# Altium footprint library Connectors.PcbLib: 158 footprints (part 4 of 10)
Each footprint in its own frame and in the unit in brackets; x right, y up, seen from the top. Pads: shape width x height; smd on the part's side, far side on the other; paste and mask are expansions set on the pad; w line width, h text height; cw(c..) or ccw(c..) is an arc to the next point about the centre after c.
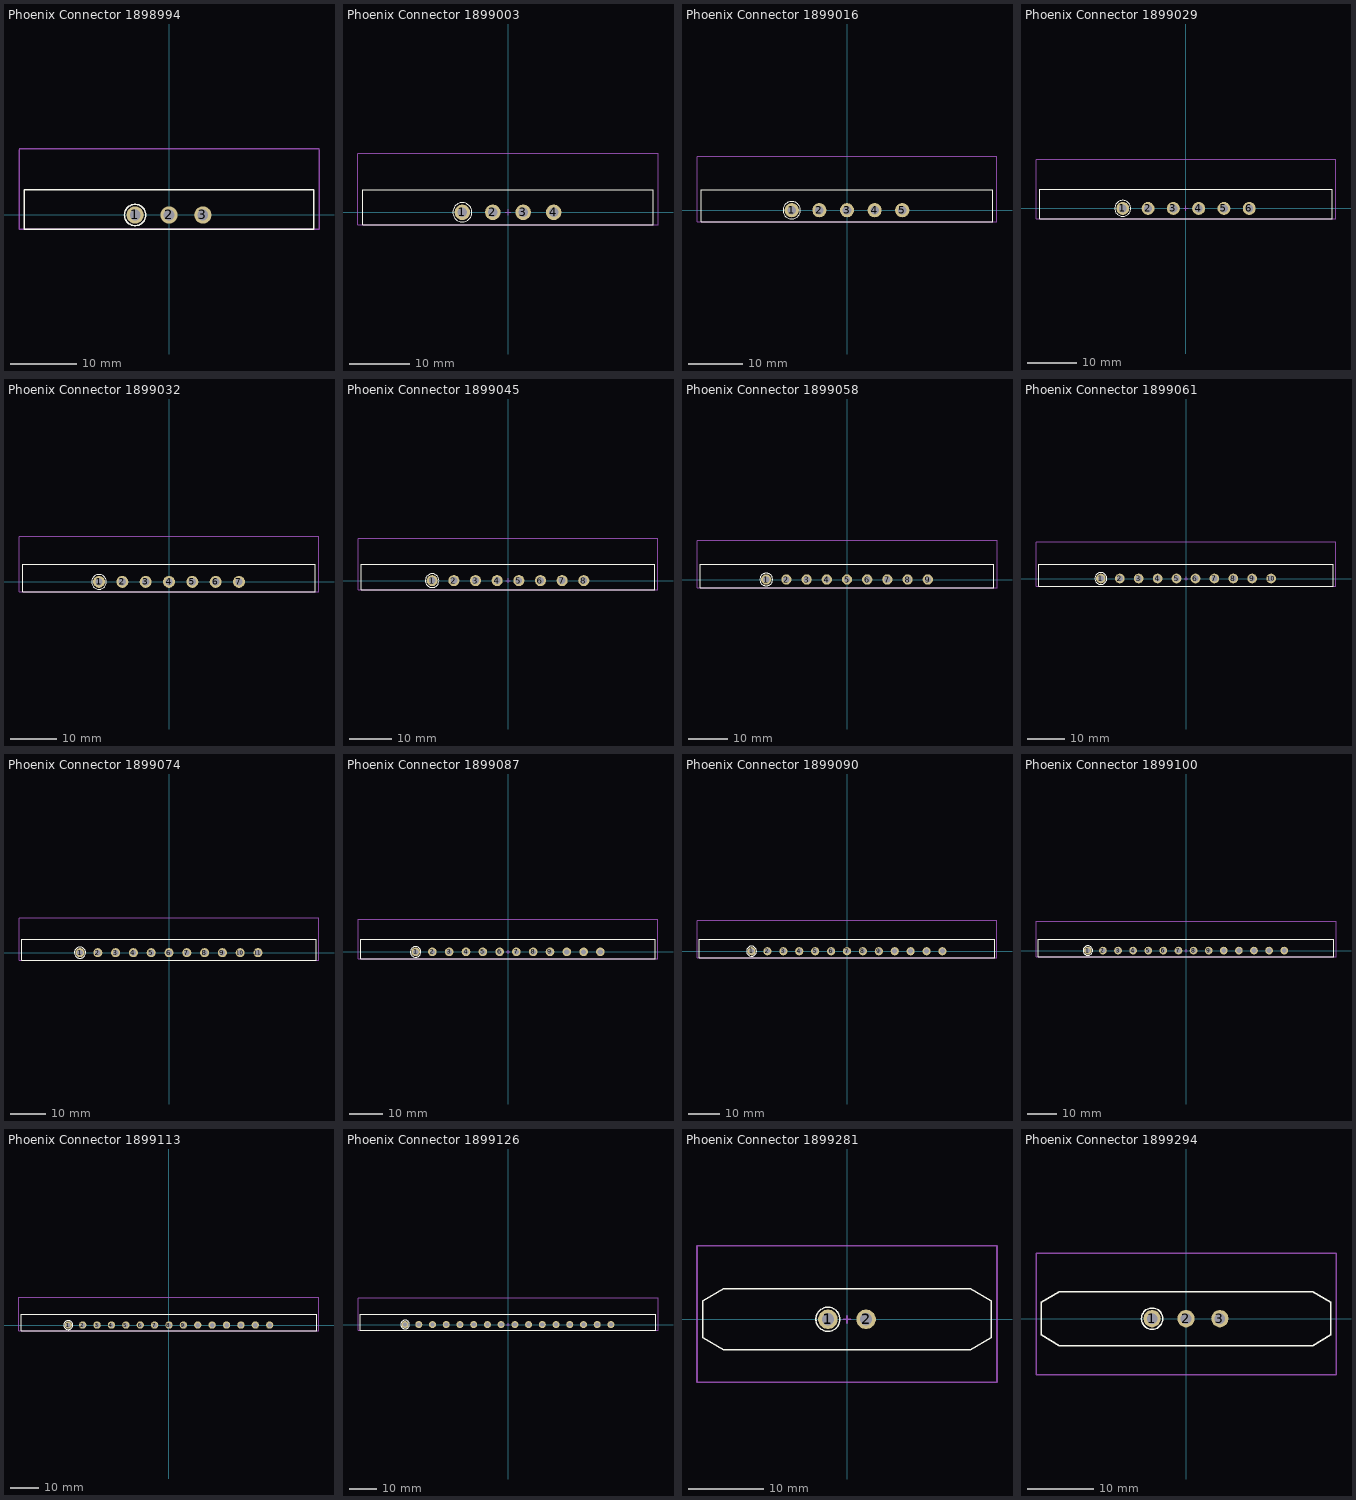
[diagram p3: the footprints below, top view; thin cyan lines are the x and y axes]

## Phoenix Connector 1898994 [mm]
height 14.1
pads (3):
  round 2.6 hole 1.6: 1(-5.08,0) 2(0,0) 3(5.08,0)
Top Overlay:
  circle w0.2: c-5.08,0 r1.6
  lines w0.2: -21.71,-2.1 21.71,-2.1 21.71,3.8 -21.71,3.8 -21.71,-2.1
Mechanical 15:
  lines w0.2: -22.5,9.8 -22.5,-2.1 22.5,-2.1 22.5,9.8 ; -22.5,9.9 22.5,9.9 ; -0.5,0 0.5,0 ; 0,-0.5 0,0.5
3D body "Phoenix Contact 1898994.stp": height 15.18, standoff -4.89, extent -23.437,-2.007 23.437,9.996

## Phoenix Connector 1899003 [mm]
height 14.1
pads (4):
  round 2.6 hole 1.6: 1(-7.62,0) 2(-2.54,0) 3(2.54,0) 4(7.62,0)
Top Overlay:
  circle w0.2: c-7.62,0 r1.6
  lines w0.2: -24.25,-2.1 24.25,-2.1 24.25,3.8 -24.25,3.8 -24.25,-2.1
Mechanical 15:
  lines w0.2: -25.04,9.8 -25.04,-2.1 25.04,-2.1 25.04,9.8 ; -25.04,9.9 25.04,9.9 ; -0.5,0 0.5,0 ; 0,-0.5 0,0.5
3D body "Phoenix Contact 1899003.stp": height 15.18, standoff -4.89, extent -25.977,-2.007 25.977,9.996

## Phoenix Connector 1899016 [mm]
height 14.1
pads (5):
  round 2.6 hole 1.6: 1(-10.16,0) 2(-5.08,0) 3(0,0) 4(5.08,0) 5(10.16,0)
Top Overlay:
  circle w0.2: c-10.16,0 r1.6
  lines w0.2: -26.79,-2.1 -26.79,3.8 26.79,3.8 26.79,-2.1 -26.79,-2.1
Mechanical 15:
  lines w0.2: -27.58,9.8 -27.58,-2.1 27.58,-2.1 27.58,9.8 ; -27.58,9.9 27.58,9.9 ; -0.5,0 0.5,0 ; 0,-0.5 0,0.5
3D body "Phoenix Contact 1899016.stp": height 15.18, standoff -4.89, extent -28.517,-2.007 28.517,9.996

## Phoenix Connector 1899029 [mm]
height 14.1
pads (6):
  round 2.6 hole 1.6: 1(-12.7,0) 2(-7.62,0) 3(-2.54,0) 4(2.54,0) 5(7.62,0) 6(12.7,0)
Top Overlay:
  circle w0.2: c-12.7,0 r1.6
  lines w0.2: -29.33,-2.1 -29.33,3.8 29.33,3.8 29.33,-2.1 -29.33,-2.1
Mechanical 15:
  lines w0.2: -30.12,9.8 -30.12,-2.1 30.12,-2.1 30.12,9.8 ; -30.12,9.9 30.12,9.9 ; -0.5,0 0.5,0 ; 0,-0.5 0,0.5
3D body "Phoenix Contact 1899029.stp": height 15.18, standoff -4.89, extent -31.057,-2.007 31.057,9.996

## Phoenix Connector 1899032 [mm]
height 14.1
pads (7):
  round 2.6 hole 1.6: 1(-15.24,0) 2(-10.16,0) 3(-5.08,0) 4(0,0) 5(5.08,0) 6(10.16,0) 7(15.24,0)
Top Overlay:
  circle w0.2: c-15.24,0 r1.6
  lines w0.2: -31.87,-2.1 31.87,-2.1 31.87,3.8 -31.87,3.8 -31.87,-2.1
Mechanical 15:
  lines w0.2: -32.66,9.8 -32.66,-2.1 32.66,-2.1 32.66,9.8 ; -32.66,9.9 32.66,9.9 ; -0.5,0 0.5,0 ; 0,-0.5 0,0.5
3D body "Phoenix Contact 1899032.stp": height 15.18, standoff -4.89, extent -33.597,-2.007 33.597,9.996

## Phoenix Connector 1899045 [mm]
height 14.1
pads (8):
  round 2.6 hole 1.6: 1(-17.78,0) 2(-12.7,0) 3(-7.62,0) 4(-2.54,0) 5(2.54,0) 6(7.62,0) 7(12.7,0) 8(17.78,0)
Top Overlay:
  circle w0.2: c-17.78,0 r1.6
  lines w0.2: -34.41,-2.1 34.41,-2.1 34.41,3.8 -34.41,3.8 -34.41,-2.1
Mechanical 15:
  lines w0.2: -35.2,9.8 -35.2,-2.1 35.2,-2.1 35.2,9.8 ; -35.2,9.9 35.2,9.9 ; -0.5,0 0.5,0 ; 0,-0.5 0,0.5
3D body "Phoenix Contact 1899045.stp": height 15.18, standoff -4.89, extent -36.137,-2.007 36.137,9.996

## Phoenix Connector 1899058 [mm]
height 14.1
pads (9):
  round 2.6 hole 1.6: 1(-20.32,0) 2(-15.24,0) 3(-10.16,0) 4(-5.08,0) 5(0,0) 6(5.08,0) 7(10.16,0) 8(15.24,0) 9(20.32,0)
Top Overlay:
  circle w0.2: c-20.32,0 r1.6
  lines w0.2: -36.95,-2.1 36.95,-2.1 36.95,3.8 -36.95,3.8 -36.95,-2.1
Mechanical 15:
  lines w0.2: -37.74,9.8 -37.74,-2.1 37.74,-2.1 37.74,9.8 ; -37.74,9.9 37.74,9.9 ; -0.5,0 0.5,0 ; 0,-0.5 0,0.5
3D body "Phoenix Contact 1899058.stp": height 15.18, standoff -4.89, extent -38.677,-2.007 38.677,9.996

## Phoenix Connector 1899061 [mm]
height 14.1
pads (10):
  round 2.6 hole 1.6: 1(-22.86,0) 2(-17.78,0) 3(-12.7,0) 4(-7.62,0) 5(-2.54,0) 6(2.54,0) 7(7.62,0) 8(12.7,0) 9(17.78,0) 10(22.86,0)
Top Overlay:
  circle w0.2: c-22.86,0 r1.6
  lines w0.2: -39.49,-2.1 39.49,-2.1 39.49,3.8 -39.49,3.8 -39.49,-2.1
Mechanical 15:
  lines w0.2: -40.28,9.8 -40.28,-2.1 40.28,-2.1 40.28,9.8 ; -40.28,9.9 40.28,9.9 ; -0.5,0 0.5,0 ; 0,-0.5 0,0.5
3D body "Phoenix Contact 1899061.stp": height 15.18, standoff -4.89, extent -41.217,-2.007 41.217,9.996

## Phoenix Connector 1899074 [mm]
height 14.1
pads (11):
  round 2.6 hole 1.6: 1(-25.4,0) 2(-20.32,0) 3(-15.24,0) 4(-10.16,0) 5(-5.08,0) 6(0,0) 7(5.08,0) 8(10.16,0) 9(15.24,0) 10(20.32,0) 11(25.4,0)
Top Overlay:
  circle w0.2: c-25.4,0 r1.6
  lines w0.2: -42.03,-2.1 -42.03,3.8 42.03,3.8 42.03,-2.1 -42.03,-2.1
Mechanical 15:
  lines w0.2: -42.82,9.8 -42.82,-2.1 42.82,-2.1 42.82,9.8 ; -42.82,9.9 42.82,9.9 ; -0.5,0 0.5,0 ; 0,-0.5 0,0.5
3D body "Phoenix Contact 1899074.stp": height 15.18, standoff -4.89, extent -43.757,-2.007 43.757,9.996

## Phoenix Connector 1899087 [mm]
height 14.1
pads (12):
  round 2.6 hole 1.6: 1(-27.94,0) 2(-22.86,0) 3(-17.78,0) 4(-12.7,0) 5(-7.62,0) 6(-2.54,0) 7(2.54,0) 8(7.62,0) 9(12.7,0) 10(17.78,0) 11(22.86,0) 12(27.94,0)
Top Overlay:
  circle w0.2: c-27.94,0 r1.6
  lines w0.2: -44.57,-2.1 -44.57,3.8 44.57,3.8 44.57,-2.1 -44.57,-2.1
Mechanical 15:
  lines w0.2: -45.36,9.8 -45.36,-2.1 45.36,-2.1 45.36,9.8 ; -45.36,9.9 45.36,9.9 ; -0.5,0 0.5,0 ; 0,-0.5 0,0.5
3D body "Phoenix Contact 1899087.stp": height 15.18, standoff -4.89, extent -46.297,-2.007 46.297,9.996

## Phoenix Connector 1899090 [mm]
height 14.1
pads (13):
  round 2.6 hole 1.6: 1(-30.48,0) 2(-25.4,0) 3(-20.32,0) 4(-15.24,0) 5(-10.16,0) 6(-5.08,0) 7(0,0) 8(5.08,0) 9(10.16,0) 10(15.24,0) 11(20.32,0) 12(25.4,0) 13(30.48,0)
Top Overlay:
  circle w0.2: c-30.48,0 r1.6
  lines w0.2: -47.11,-2.1 -47.11,3.8 47.11,3.8 47.11,-2.1 -47.11,-2.1
Mechanical 15:
  lines w0.2: -47.9,9.8 -47.9,-2.1 47.9,-2.1 47.9,9.8 ; -47.9,9.9 47.9,9.9 ; -0.5,0 0.5,0 ; 0,-0.5 0,0.5
3D body "Phoenix Contact 1899090.stp": height 15.18, standoff -4.89, extent -48.837,-2.007 48.837,9.996

## Phoenix Connector 1899100 [mm]
height 14.1
pads (14):
  round 2.6 hole 1.6: 1(-33.02,0) 2(-27.94,0) 3(-22.86,0) 4(-17.78,0) 5(-12.7,0) 6(-7.62,0) 7(-2.54,0) 8(2.54,0) 9(7.62,0) 10(12.7,0) 11(17.78,0) 12(22.86,0) 13(27.94,0) 14(33.02,0)
Top Overlay:
  circle w0.2: c-33.02,0 r1.6
  lines w0.2: -49.65,-2.1 -49.65,3.8 49.65,3.8 49.65,-2.1 -49.65,-2.1
Mechanical 15:
  lines w0.2: -50.44,9.8 -50.44,-2.1 50.44,-2.1 50.44,9.8 ; -50.44,9.9 50.44,9.9 ; -0.5,0 0.5,0 ; 0,-0.5 0,0.5
3D body "Phoenix Contact 1899100.stp": height 15.18, standoff -4.89, extent -51.377,-2.007 51.377,9.996

## Phoenix Connector 1899113 [mm]
height 14.1
pads (15):
  round 2.6 hole 1.6: 1(-35.56,0) 2(-30.48,0) 3(-25.4,0) 4(-20.32,0) 5(-15.24,0) 6(-10.16,0) 7(-5.08,0) 8(0,0) 9(5.08,0) 10(10.16,0) 11(15.24,0) 12(20.32,0) 13(25.4,0) 14(30.48,0) 15(35.56,0)
Top Overlay:
  circle w0.2: c-35.56,0 r1.6
  lines w0.2: -52.19,-2.1 52.19,-2.1 52.19,3.8 -52.19,3.8 -52.19,-2.1
Mechanical 15:
  lines w0.2: -52.98,9.8 -52.98,-2.1 52.98,-2.1 52.98,9.8 ; -52.98,9.9 52.98,9.9 ; -0.5,0 0.5,0 ; 0,-0.5 0,0.5
3D body "Phoenix Contact 1899113.stp": height 15.18, standoff -4.89, extent -53.917,-2.007 53.917,9.996

## Phoenix Connector 1899126 [mm]
height 14.1
pads (16):
  round 2.6 hole 1.6: 1(-38.1,0) 2(-33.02,0) 3(-27.94,0) 4(-22.86,0) 5(-17.78,0) 6(-12.7,0) 7(-7.62,0) 8(-2.54,0) 9(2.54,0) 10(7.62,0) 11(12.7,0) 12(17.78,0) 13(22.86,0) 14(27.94,0) 15(33.02,0) 16(38.1,0)
Top Overlay:
  circle w0.2: c-38.1,0 r1.6
  lines w0.2: -54.73,-2.1 54.73,-2.1 54.73,3.8 -54.73,3.8 -54.73,-2.1
Mechanical 15:
  lines w0.2: -55.52,9.8 -55.52,-2.1 55.52,-2.1 55.52,9.8 ; -55.52,9.9 55.52,9.9 ; -0.5,0 0.5,0 ; 0,-0.5 0,0.5
3D body "Phoenix Contact 1899126.stp": height 15.18, standoff -4.89, extent -56.457,-2.007 56.457,9.996

## Phoenix Connector 1899281 [mm]
height 12
pads (2):
  round 2.6 hole 1.6: 1(-2.54,0) 2(2.54,0)
Top Overlay:
  circle w0.2: c-2.54,0 r1.6
  lines w0.2: -16.44,4.05 -19.17,2.45 -19.17,-2.45 -16.44,-4.05 16.44,-4.05 19.17,-2.45 19.17,2.45 16.44,4.05 -16.4,4.05
Mechanical 15:
  lines w0.2: -0.5,0 0.5,0 ; 0,-0.5 0,0.5 ; -19.96,-8.4 19.96,-8.4 19.96,9.8 -19.96,9.8 -19.96,-8.4
3D body "Phoenix Contact 1899281.stp": height 12.55, standoff -3.35, extent -20.897,-9.337 20.897,10.737

## Phoenix Connector 1899294 [mm]
height 12
pads (3):
  round 2.6 hole 1.6: 1(-5.08,0) 2(0,0) 3(5.08,0)
Top Overlay:
  circle w0.2: c-5.08,0 r1.6
  lines w0.2: -21.71,-2.45 -18.98,-4.05 18.98,-4.05 21.71,-2.45 21.71,2.45 18.98,4.05 -18.98,4.05 -21.71,2.45 -21.71,-2.45
Mechanical 15:
  lines w0.2: -0.5,0 0.5,0 ; 0,-0.5 0,0.5 ; -22.5,-8.4 22.5,-8.4 22.5,9.8 -22.5,9.8 -22.5,-8.4
3D body "Phoenix Contact 1899294.stp": height 12.55, standoff -3.35, extent -23.437,-9.337 23.437,10.737